# Altium footprint library smd-ipc.PCBLIB: 363 footprints (part 23 of 27)
Each footprint in its own frame and in the unit in brackets; x right, y up, seen from the top. Pads: shape width x height; smd on the part's side, far side on the other; paste and mask are expansions set on the pad; w line width, h text height; cw(c..) or ccw(c..) is an arc to the next point about the centre after c.
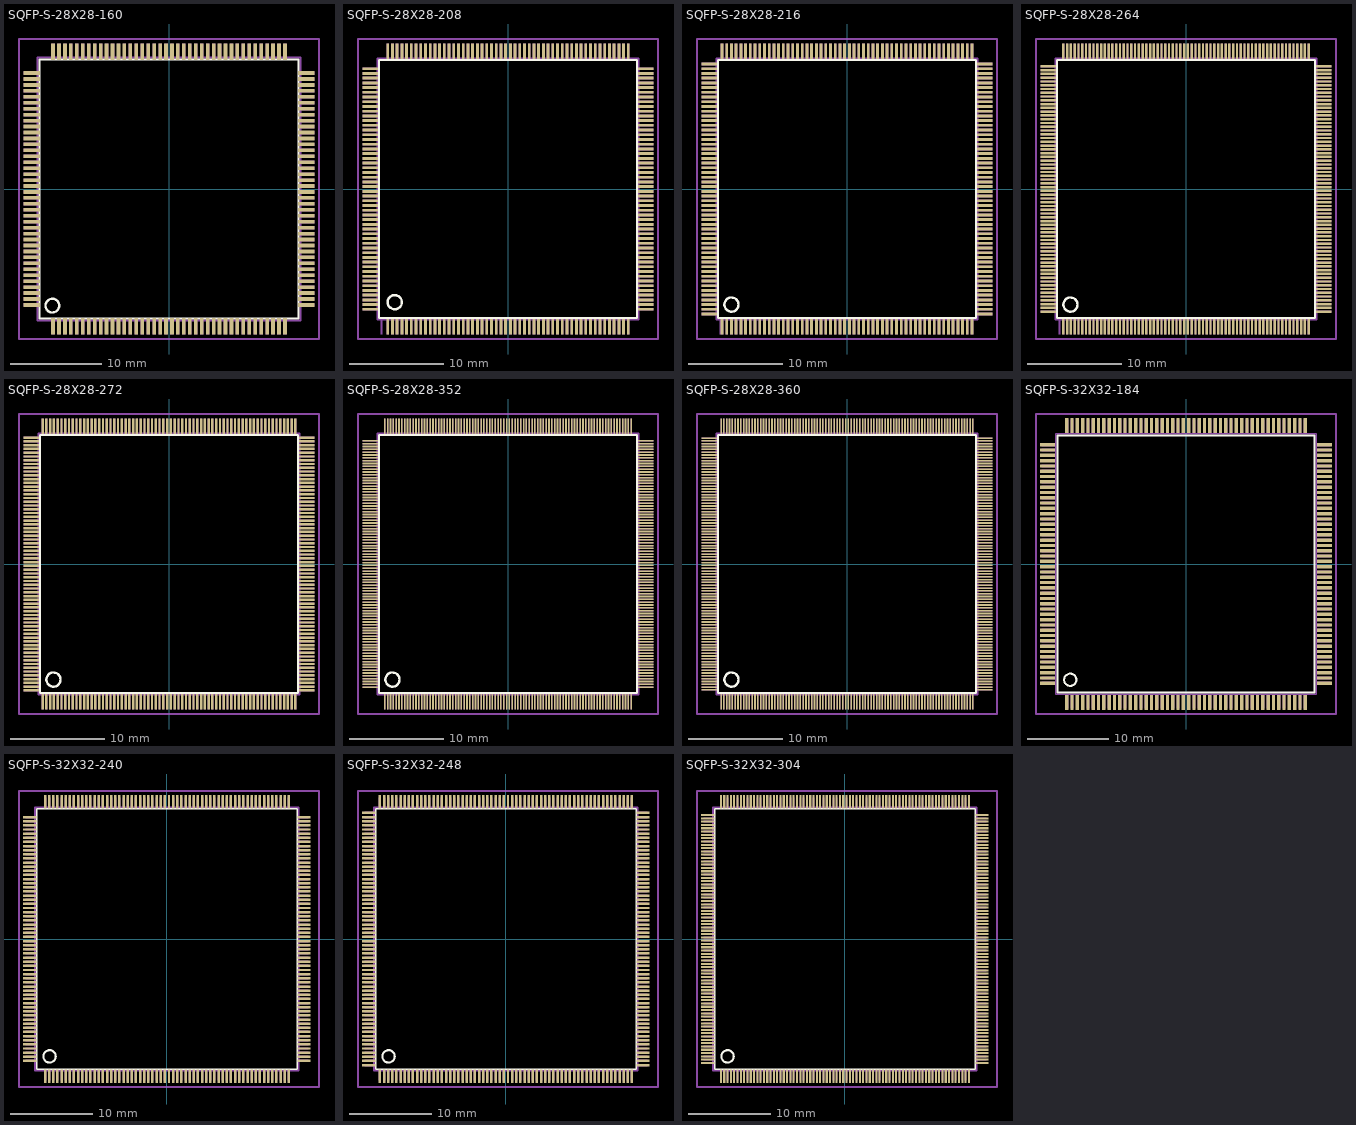
[diagram p22: the footprints below, top view; thin cyan lines are the x and y axes]

## SQFP-S-28X28-160 [mm]
pads (160):
  rect 0.4x1.8 smd: 1(-12.675,-15) 2(-12.025,-15) 3(-11.375,-15) 4(-10.725,-15) 5(-10.075,-15) 6(-9.425,-15) 7(-8.775,-15) 8(-8.125,-15) 9(-7.475,-15) 10(-6.825,-15) 11(-6.175,-15) 12(-5.525,-15) 13(-4.875,-15) 14(-4.225,-15) 15(-3.575,-15) 16(-2.925,-15) 17(-2.275,-15) 18(-1.625,-15) 19(-0.975,-15) 20(-0.325,-15) 21(0.325,-15) 22(0.975,-15) 23(1.625,-15) 24(2.275,-15) 25(2.925,-15) 26(3.575,-15) 27(4.225,-15) 28(4.875,-15) 29(5.525,-15) 30(6.175,-15) 31(6.825,-15) 32(7.475,-15) 33(8.125,-15) 34(8.775,-15) 35(9.425,-15) 36(10.075,-15) 37(10.725,-15) 38(11.375,-15) 39(12.025,-15) 40(12.675,-15) 81(12.675,15) 82(12.025,15) 83(11.375,15) 84(10.725,15) 85(10.075,15) 86(9.425,15) 87(8.775,15) 88(8.125,15) 89(7.475,15) 90(6.825,15) 91(6.175,15) 92(5.525,15) 93(4.875,15) 94(4.225,15) 95(3.575,15) 96(2.925,15) 97(2.275,15) 98(1.625,15) 99(0.975,15) 100(0.325,15) 101(-0.325,15) 102(-0.975,15) 103(-1.625,15) 104(-2.275,15) 105(-2.925,15) 106(-3.575,15) 107(-4.225,15) 108(-4.875,15) 109(-5.525,15) 110(-6.175,15) 111(-6.825,15) 112(-7.475,15) 113(-8.125,15) 114(-8.775,15) 115(-9.425,15) 116(-10.075,15) 117(-10.725,15) 118(-11.375,15) 119(-12.025,15) 120(-12.675,15)
  rect 1.8x0.4 smd: 41(15,-12.675) 42(15,-12.025) 43(15,-11.375) 44(15,-10.725) 45(15,-10.075) 46(15,-9.425) 47(15,-8.775) 48(15,-8.125) 49(15,-7.475) 50(15,-6.825) 51(15,-6.175) 52(15,-5.525) 53(15,-4.875) 54(15,-4.225) 55(15,-3.575) 56(15,-2.925) 57(15,-2.275) 58(15,-1.625) 59(15,-0.975) 60(15,-0.325) 61(15,0.325) 62(15,0.975) 63(15,1.625) 64(15,2.275) 65(15,2.925) 66(15,3.575) 67(15,4.225) 68(15,4.875) 69(15,5.525) 70(15,6.175) 71(15,6.825) 72(15,7.475) 73(15,8.125) 74(15,8.775) 75(15,9.425) 76(15,10.075) 77(15,10.725) 78(15,11.375) 79(15,12.025) 80(15,12.675) 121(-15,12.675) 122(-15,12.025) 123(-15,11.375) 124(-15,10.725) 125(-15,10.075) 126(-15,9.425) 127(-15,8.775) 128(-15,8.125) 129(-15,7.475) 130(-15,6.825) 131(-15,6.175) 132(-15,5.525) 133(-15,4.875) 134(-15,4.225) 135(-15,3.575) 136(-15,2.925) 137(-15,2.275) 138(-15,1.625) 139(-15,0.975) 140(-15,0.325) 141(-15,-0.325) 142(-15,-0.975) 143(-15,-1.625) 144(-15,-2.275) 145(-15,-2.925) 146(-15,-3.575) 147(-15,-4.225) 148(-15,-4.875) 149(-15,-5.525) 150(-15,-6.175) 151(-15,-6.825) 152(-15,-7.475) 153(-15,-8.125) 154(-15,-8.775) 155(-15,-9.425) 156(-15,-10.075) 157(-15,-10.725) 158(-15,-11.375) 159(-15,-12.025) 160(-15,-12.675)
Top Overlay:
  circle w0.254: c-12.75,-12.75 r0.75
  lines w0.203: -14.17,-14.16 14.16,-14.16 14.16,14.16 -14.17,14.16 -14.17,-14.16
Mechanical 16:
  drawing of 164 lines, arcs and shapes, not listed
Mechanical 27:
  lines w0.2: -16.4,-16.4 -16.4,16.4 16.4,16.4 16.4,-16.4 -16.4,-16.4

## SQFP-S-28X28-208 [mm]
pads (208):
  rect 0.3x1.6 smd: 1(-12.75,-14.6) 2(-12.25,-14.6) 3(-11.75,-14.6) 4(-11.25,-14.6) 5(-10.75,-14.6) 6(-10.25,-14.6) 7(-9.75,-14.6) 8(-9.25,-14.6) 9(-8.75,-14.6) 10(-8.25,-14.6) 11(-7.75,-14.6) 12(-7.25,-14.6) 13(-6.75,-14.6) 14(-6.25,-14.6) 15(-5.75,-14.6) 16(-5.25,-14.6) 17(-4.75,-14.6) 18(-4.25,-14.6) 19(-3.75,-14.6) 20(-3.25,-14.6) 21(-2.75,-14.6) 22(-2.25,-14.6) 23(-1.75,-14.6) 24(-1.25,-14.6) 25(-0.75,-14.6) 26(-0.25,-14.6) 27(0.25,-14.6) 28(0.75,-14.6) 29(1.25,-14.6) 30(1.75,-14.6) 31(2.25,-14.6) 32(2.75,-14.6) 33(3.25,-14.6) 34(3.75,-14.6) 35(4.25,-14.6) 36(4.75,-14.6) 37(5.25,-14.6) 38(5.75,-14.6) 39(6.25,-14.6) 40(6.75,-14.6) 41(7.25,-14.6) 42(7.75,-14.6) 43(8.25,-14.6) 44(8.75,-14.6) 45(9.25,-14.6) 46(9.75,-14.6) 47(10.25,-14.6) 48(10.75,-14.6) 49(11.25,-14.6) 50(11.75,-14.6) 51(12.25,-14.6) 52(12.75,-14.6) 105(12.75,14.6) 106(12.25,14.6) 107(11.75,14.6) 108(11.25,14.6) 109(10.75,14.6) 110(10.25,14.6) 111(9.75,14.6) 112(9.25,14.6) 113(8.75,14.6) 114(8.25,14.6) 115(7.75,14.6) 116(7.25,14.6) 117(6.75,14.6) 118(6.25,14.6) 119(5.75,14.6) 120(5.25,14.6) 121(4.75,14.6) 122(4.25,14.6) 123(3.75,14.6) 124(3.25,14.6) 125(2.75,14.6) 126(2.25,14.6) 127(1.75,14.6) 128(1.25,14.6) 129(0.75,14.6) 130(0.25,14.6) 131(-0.25,14.6) 132(-0.75,14.6) 133(-1.25,14.6) 134(-1.75,14.6) 135(-2.25,14.6) 136(-2.75,14.6) 137(-3.25,14.6) 138(-3.75,14.6) 139(-4.25,14.6) 140(-4.75,14.6) 141(-5.25,14.6) 142(-5.75,14.6) 143(-6.25,14.6) 144(-6.75,14.6) 145(-7.25,14.6) 146(-7.75,14.6) 147(-8.25,14.6) 148(-8.75,14.6) 149(-9.25,14.6) 150(-9.75,14.6) 151(-10.25,14.6) 152(-10.75,14.6) 153(-11.25,14.6) 154(-11.75,14.6) 155(-12.25,14.6) 156(-12.75,14.6)
  rect 1.6x0.3 smd: 53(14.6,-12.75) 54(14.6,-12.25) 55(14.6,-11.75) 56(14.6,-11.25) 57(14.6,-10.75) 58(14.6,-10.25) 59(14.6,-9.75) 60(14.6,-9.25) 61(14.6,-8.75) 62(14.6,-8.25) 63(14.6,-7.75) 64(14.6,-7.25) 65(14.6,-6.75) 66(14.6,-6.25) 67(14.6,-5.75) 68(14.6,-5.25) 69(14.6,-4.75) 70(14.6,-4.25) 71(14.6,-3.75) 72(14.6,-3.25) 73(14.6,-2.75) 74(14.6,-2.25) 75(14.6,-1.75) 76(14.6,-1.25) 77(14.6,-0.75) 78(14.6,-0.25) 79(14.6,0.25) 80(14.6,0.75) 81(14.6,1.25) 82(14.6,1.75) 83(14.6,2.25) 84(14.6,2.75) 85(14.6,3.25) 86(14.6,3.75) 87(14.6,4.25) 88(14.6,4.75) 89(14.6,5.25) 90(14.6,5.75) 91(14.6,6.25) 92(14.6,6.75) 93(14.6,7.25) 94(14.6,7.75) 95(14.6,8.25) 96(14.6,8.75) 97(14.6,9.25) 98(14.6,9.75) 99(14.6,10.25) 100(14.6,10.75) 101(14.6,11.25) 102(14.6,11.75) 103(14.6,12.25) 104(14.6,12.75) 157(-14.6,12.75) 158(-14.6,12.25) 159(-14.6,11.75) 160(-14.6,11.25) 161(-14.6,10.75) 162(-14.6,10.25) 163(-14.6,9.75) 164(-14.6,9.25) 165(-14.6,8.75) 166(-14.6,8.25) 167(-14.6,7.75) 168(-14.6,7.25) 169(-14.6,6.75) 170(-14.6,6.25) 171(-14.6,5.75) 172(-14.6,5.25) 173(-14.6,4.75) 174(-14.6,4.25) 175(-14.6,3.75) 176(-14.6,3.25) 177(-14.6,2.75) 178(-14.6,2.25) 179(-14.6,1.75) 180(-14.6,1.25) 181(-14.6,0.75) 182(-14.6,0.25) 183(-14.6,-0.25) 184(-14.6,-0.75) 185(-14.6,-1.25) 186(-14.6,-1.75) 187(-14.6,-2.25) 188(-14.6,-2.75) 189(-14.6,-3.25) 190(-14.6,-3.75) 191(-14.6,-4.25) 192(-14.6,-4.75) 193(-14.6,-5.25) 194(-14.6,-5.75) 195(-14.6,-6.25) 196(-14.6,-6.75) 197(-14.6,-7.25) 198(-14.6,-7.75) 199(-14.6,-8.25) 200(-14.6,-8.75) 201(-14.6,-9.25) 202(-14.6,-9.75) 203(-14.6,-10.25) 204(-14.6,-10.75) 205(-14.6,-11.25) 206(-14.6,-11.75) 207(-14.6,-12.25) 208(-14.6,-12.75)
Top Overlay:
  circle w0.254: c-12,-12 r0.75
  lines w0.203: -13.67,-13.66 13.66,-13.66 13.66,13.66 -13.67,13.66 -13.67,-13.66
Mechanical 16:
  drawing of 213 lines, arcs and shapes, not listed
Mechanical 27:
  lines w0.2: -15.9,-15.9 -15.9,15.9 15.9,15.9 15.9,-15.9 -15.9,-15.9

## SQFP-S-28X28-216 [mm]
pads (216):
  rect 0.3x1.6 smd: 1(-13.25,-14.6) 2(-12.75,-14.6) 3(-12.25,-14.6) 4(-11.75,-14.6) 5(-11.25,-14.6) 6(-10.75,-14.6) 7(-10.25,-14.6) 8(-9.75,-14.6) 9(-9.25,-14.6) 10(-8.75,-14.6) 11(-8.25,-14.6) 12(-7.75,-14.6) 13(-7.25,-14.6) 14(-6.75,-14.6) 15(-6.25,-14.6) 16(-5.75,-14.6) 17(-5.25,-14.6) 18(-4.75,-14.6) 19(-4.25,-14.6) 20(-3.75,-14.6) 21(-3.25,-14.6) 22(-2.75,-14.6) 23(-2.25,-14.6) 24(-1.75,-14.6) 25(-1.25,-14.6) 26(-0.75,-14.6) 27(-0.25,-14.6) 28(0.25,-14.6) 29(0.75,-14.6) 30(1.25,-14.6) 31(1.75,-14.6) 32(2.25,-14.6) 33(2.75,-14.6) 34(3.25,-14.6) 35(3.75,-14.6) 36(4.25,-14.6) 37(4.75,-14.6) 38(5.25,-14.6) 39(5.75,-14.6) 40(6.25,-14.6) 41(6.75,-14.6) 42(7.25,-14.6) 43(7.75,-14.6) 44(8.25,-14.6) 45(8.75,-14.6) 46(9.25,-14.6) 47(9.75,-14.6) 48(10.25,-14.6) 49(10.75,-14.6) 50(11.25,-14.6) 51(11.75,-14.6) 52(12.25,-14.6) 53(12.75,-14.6) 54(13.25,-14.6) 109(13.25,14.6) 110(12.75,14.6) 111(12.25,14.6) 112(11.75,14.6) 113(11.25,14.6) 114(10.75,14.6) 115(10.25,14.6) 116(9.75,14.6) 117(9.25,14.6) 118(8.75,14.6) 119(8.25,14.6) 120(7.75,14.6) 121(7.25,14.6) 122(6.75,14.6) 123(6.25,14.6) 124(5.75,14.6) 125(5.25,14.6) 126(4.75,14.6) 127(4.25,14.6) 128(3.75,14.6) 129(3.25,14.6) 130(2.75,14.6) 131(2.25,14.6) 132(1.75,14.6) 133(1.25,14.6) 134(0.75,14.6) 135(0.25,14.6) 136(-0.25,14.6) 137(-0.75,14.6) 138(-1.25,14.6) 139(-1.75,14.6) 140(-2.25,14.6) 141(-2.75,14.6) 142(-3.25,14.6) 143(-3.75,14.6) 144(-4.25,14.6) 145(-4.75,14.6) 146(-5.25,14.6) 147(-5.75,14.6) 148(-6.25,14.6) 149(-6.75,14.6) 150(-7.25,14.6) 151(-7.75,14.6) 152(-8.25,14.6) 153(-8.75,14.6) 154(-9.25,14.6) 155(-9.75,14.6) 156(-10.25,14.6) 157(-10.75,14.6) 158(-11.25,14.6) 159(-11.75,14.6) 160(-12.25,14.6) 161(-12.75,14.6) 162(-13.25,14.6)
  rect 1.6x0.3 smd: 55(14.6,-13.25) 56(14.6,-12.75) 57(14.6,-12.25) 58(14.6,-11.75) 59(14.6,-11.25) 60(14.6,-10.75) 61(14.6,-10.25) 62(14.6,-9.75) 63(14.6,-9.25) 64(14.6,-8.75) 65(14.6,-8.25) 66(14.6,-7.75) 67(14.6,-7.25) 68(14.6,-6.75) 69(14.6,-6.25) 70(14.6,-5.75) 71(14.6,-5.25) 72(14.6,-4.75) 73(14.6,-4.25) 74(14.6,-3.75) 75(14.6,-3.25) 76(14.6,-2.75) 77(14.6,-2.25) 78(14.6,-1.75) 79(14.6,-1.25) 80(14.6,-0.75) 81(14.6,-0.25) 82(14.6,0.25) 83(14.6,0.75) 84(14.6,1.25) 85(14.6,1.75) 86(14.6,2.25) 87(14.6,2.75) 88(14.6,3.25) 89(14.6,3.75) 90(14.6,4.25) 91(14.6,4.75) 92(14.6,5.25) 93(14.6,5.75) 94(14.6,6.25) 95(14.6,6.75) 96(14.6,7.25) 97(14.6,7.75) 98(14.6,8.25) 99(14.6,8.75) 100(14.6,9.25) 101(14.6,9.75) 102(14.6,10.25) 103(14.6,10.75) 104(14.6,11.25) 105(14.6,11.75) 106(14.6,12.25) 107(14.6,12.75) 108(14.6,13.25) 163(-14.6,13.25) 164(-14.6,12.75) 165(-14.6,12.25) 166(-14.6,11.75) 167(-14.6,11.25) 168(-14.6,10.75) 169(-14.6,10.25) 170(-14.6,9.75) 171(-14.6,9.25) 172(-14.6,8.75) 173(-14.6,8.25) 174(-14.6,7.75) 175(-14.6,7.25) 176(-14.6,6.75) 177(-14.6,6.25) 178(-14.6,5.75) 179(-14.6,5.25) 180(-14.6,4.75) 181(-14.6,4.25) 182(-14.6,3.75) 183(-14.6,3.25) 184(-14.6,2.75) 185(-14.6,2.25) 186(-14.6,1.75) 187(-14.6,1.25) 188(-14.6,0.75) 189(-14.6,0.25) 190(-14.6,-0.25) 191(-14.6,-0.75) 192(-14.6,-1.25) 193(-14.6,-1.75) 194(-14.6,-2.25) 195(-14.6,-2.75) 196(-14.6,-3.25) 197(-14.6,-3.75) 198(-14.6,-4.25) 199(-14.6,-4.75) 200(-14.6,-5.25) 201(-14.6,-5.75) 202(-14.6,-6.25) 203(-14.6,-6.75) 204(-14.6,-7.25) 205(-14.6,-7.75) 206(-14.6,-8.25) 207(-14.6,-8.75) 208(-14.6,-9.25) 209(-14.6,-9.75) 210(-14.6,-10.25) 211(-14.6,-10.75) 212(-14.6,-11.25) 213(-14.6,-11.75) 214(-14.6,-12.25) 215(-14.6,-12.75) 216(-14.6,-13.25)
Top Overlay:
  circle w0.254: c-12.25,-12.25 r0.75
  lines w0.203: -13.67,-13.66 13.66,-13.66 13.66,13.66 -13.67,13.66 -13.67,-13.66
Mechanical 16:
  drawing of 221 lines, arcs and shapes, not listed
Mechanical 27:
  lines w0.2: -15.9,-15.9 -15.9,15.9 15.9,15.9 15.9,-15.9 -15.9,-15.9

## SQFP-S-28X28-264 [mm]
pads (264):
  rect 0.25x1.6 smd: 1(-13,-14.6) 2(-12.6,-14.6) 3(-12.2,-14.6) 4(-11.8,-14.6) 5(-11.4,-14.6) 6(-11,-14.6) 7(-10.6,-14.6) 8(-10.2,-14.6) 9(-9.8,-14.6) 10(-9.4,-14.6) 11(-9,-14.6) 12(-8.6,-14.6) 13(-8.2,-14.6) 14(-7.8,-14.6) 15(-7.4,-14.6) 16(-7,-14.6) 17(-6.6,-14.6) 18(-6.2,-14.6) 19(-5.8,-14.6) 20(-5.4,-14.6) 21(-5,-14.6) 22(-4.6,-14.6) 23(-4.2,-14.6) 24(-3.8,-14.6) 25(-3.4,-14.6) 26(-3,-14.6) 27(-2.6,-14.6) 28(-2.2,-14.6) 29(-1.8,-14.6) 30(-1.4,-14.6) 31(-1,-14.6) 32(-0.6,-14.6) 33(-0.2,-14.6) 34(0.2,-14.6) 35(0.6,-14.6) 36(1,-14.6) 37(1.4,-14.6) 38(1.8,-14.6) 39(2.2,-14.6) 40(2.6,-14.6) 41(3,-14.6) 42(3.4,-14.6) 43(3.8,-14.6) 44(4.2,-14.6) 45(4.6,-14.6) 46(5,-14.6) 47(5.4,-14.6) 48(5.8,-14.6) 49(6.2,-14.6) 50(6.6,-14.6) 51(7,-14.6) 52(7.4,-14.6) 53(7.8,-14.6) 54(8.2,-14.6) 55(8.6,-14.6) 56(9,-14.6) 57(9.4,-14.6) 58(9.8,-14.6) 59(10.2,-14.6) 60(10.6,-14.6) 61(11,-14.6) 62(11.4,-14.6) 63(11.8,-14.6) 64(12.2,-14.6) 65(12.6,-14.6) 66(13,-14.6) 133(13,14.6) 134(12.6,14.6) 135(12.2,14.6) 136(11.8,14.6) 137(11.4,14.6) 138(11,14.6) 139(10.6,14.6) 140(10.2,14.6) 141(9.8,14.6) 142(9.4,14.6) 143(9,14.6) 144(8.6,14.6) 145(8.2,14.6) 146(7.8,14.6) 147(7.4,14.6) 148(7,14.6) 149(6.6,14.6) 150(6.2,14.6) 151(5.8,14.6) 152(5.4,14.6) 153(5,14.6) 154(4.6,14.6) 155(4.2,14.6) 156(3.8,14.6) 157(3.4,14.6) 158(3,14.6) 159(2.6,14.6) 160(2.2,14.6) 161(1.8,14.6) 162(1.4,14.6) 163(1,14.6) 164(0.6,14.6) 165(0.2,14.6) 166(-0.2,14.6) 167(-0.6,14.6) 168(-1,14.6) 169(-1.4,14.6) 170(-1.8,14.6) 171(-2.2,14.6) 172(-2.6,14.6) 173(-3,14.6) 174(-3.4,14.6) 175(-3.8,14.6) 176(-4.2,14.6) 177(-4.6,14.6) 178(-5,14.6) 179(-5.4,14.6) 180(-5.8,14.6) 181(-6.2,14.6) 182(-6.6,14.6) 183(-7,14.6) 184(-7.4,14.6) 185(-7.8,14.6) 186(-8.2,14.6) 187(-8.6,14.6) 188(-9,14.6) 189(-9.4,14.6) 190(-9.8,14.6) 191(-10.2,14.6) 192(-10.6,14.6) 193(-11,14.6) 194(-11.4,14.6) 195(-11.8,14.6) 196(-12.2,14.6) 197(-12.6,14.6) 198(-13,14.6)
  rect 1.6x0.25 smd: 67(14.6,-13) 68(14.6,-12.6) 69(14.6,-12.2) 70(14.6,-11.8) 71(14.6,-11.4) 72(14.6,-11) 73(14.6,-10.6) 74(14.6,-10.2) 75(14.6,-9.8) 76(14.6,-9.4) 77(14.6,-9) 78(14.6,-8.6) 79(14.6,-8.2) 80(14.6,-7.8) 81(14.6,-7.4) 82(14.6,-7) 83(14.6,-6.6) 84(14.6,-6.2) 85(14.6,-5.8) 86(14.6,-5.4) 87(14.6,-5) 88(14.6,-4.6) 89(14.6,-4.2) 90(14.6,-3.8) 91(14.6,-3.4) 92(14.6,-3) 93(14.6,-2.6) 94(14.6,-2.2) 95(14.6,-1.8) 96(14.6,-1.4) 97(14.6,-1) 98(14.6,-0.6) 99(14.6,-0.2) 100(14.6,0.2) 101(14.6,0.6) 102(14.6,1) 103(14.6,1.4) 104(14.6,1.8) 105(14.6,2.2) 106(14.6,2.6) 107(14.6,3) 108(14.6,3.4) 109(14.6,3.8) 110(14.6,4.2) 111(14.6,4.6) 112(14.6,5) 113(14.6,5.4) 114(14.6,5.8) 115(14.6,6.2) 116(14.6,6.6) 117(14.6,7) 118(14.6,7.4) 119(14.6,7.8) 120(14.6,8.2) 121(14.6,8.6) 122(14.6,9) 123(14.6,9.4) 124(14.6,9.8) 125(14.6,10.2) 126(14.6,10.6) 127(14.6,11) 128(14.6,11.4) 129(14.6,11.8) 130(14.6,12.2) 131(14.6,12.6) 132(14.6,13) 199(-14.6,13) 200(-14.6,12.6) 201(-14.6,12.2) 202(-14.6,11.8) 203(-14.6,11.4) 204(-14.6,11) 205(-14.6,10.6) 206(-14.6,10.2) 207(-14.6,9.8) 208(-14.6,9.4) 209(-14.6,9) 210(-14.6,8.6) 211(-14.6,8.2) 212(-14.6,7.8) 213(-14.6,7.4) 214(-14.6,7) 215(-14.6,6.6) 216(-14.6,6.2) 217(-14.6,5.8) 218(-14.6,5.4) 219(-14.6,5) 220(-14.6,4.6) 221(-14.6,4.2) 222(-14.6,3.8) 223(-14.6,3.4) 224(-14.6,3) 225(-14.6,2.6) 226(-14.6,2.2) 227(-14.6,1.8) 228(-14.6,1.4) 229(-14.6,1) 230(-14.6,0.6) 231(-14.6,0.2) 232(-14.6,-0.2) 233(-14.6,-0.6) 234(-14.6,-1) 235(-14.6,-1.4) 236(-14.6,-1.8) 237(-14.6,-2.2) 238(-14.6,-2.6) 239(-14.6,-3) 240(-14.6,-3.4) 241(-14.6,-3.8) 242(-14.6,-4.2) 243(-14.6,-4.6) 244(-14.6,-5) 245(-14.6,-5.4) 246(-14.6,-5.8) 247(-14.6,-6.2) 248(-14.6,-6.6) 249(-14.6,-7) 250(-14.6,-7.4) 251(-14.6,-7.8) 252(-14.6,-8.2) 253(-14.6,-8.6) 254(-14.6,-9) 255(-14.6,-9.4) 256(-14.6,-9.8) 257(-14.6,-10.2) 258(-14.6,-10.6) 259(-14.6,-11) 260(-14.6,-11.4) 261(-14.6,-11.8) 262(-14.6,-12.2) 263(-14.6,-12.6) 264(-14.6,-13)
Top Overlay:
  circle w0.254: c-12.25,-12.25 r0.75
  lines w0.203: -13.67,-13.66 13.66,-13.66 13.66,13.66 -13.67,13.66 -13.67,-13.66
Mechanical 16:
  drawing of 269 lines, arcs and shapes, not listed
Mechanical 27:
  lines w0.2: -15.9,-15.9 -15.9,15.9 15.9,15.9 15.9,-15.9 -15.9,-15.9

## SQFP-S-28X28-272 [mm]
pads (272):
  rect 0.25x1.6 smd: 1(-13.4,-14.6) 2(-13,-14.6) 3(-12.6,-14.6) 4(-12.2,-14.6) 5(-11.8,-14.6) 6(-11.4,-14.6) 7(-11,-14.6) 8(-10.6,-14.6) 9(-10.2,-14.6) 10(-9.8,-14.6) 11(-9.4,-14.6) 12(-9,-14.6) 13(-8.6,-14.6) 14(-8.2,-14.6) 15(-7.8,-14.6) 16(-7.4,-14.6) 17(-7,-14.6) 18(-6.6,-14.6) 19(-6.2,-14.6) 20(-5.8,-14.6) 21(-5.4,-14.6) 22(-5,-14.6) 23(-4.6,-14.6) 24(-4.2,-14.6) 25(-3.8,-14.6) 26(-3.4,-14.6) 27(-3,-14.6) 28(-2.6,-14.6) 29(-2.2,-14.6) 30(-1.8,-14.6) 31(-1.4,-14.6) 32(-1,-14.6) 33(-0.6,-14.6) 34(-0.2,-14.6) 35(0.2,-14.6) 36(0.6,-14.6) 37(1,-14.6) 38(1.4,-14.6) 39(1.8,-14.6) 40(2.2,-14.6) 41(2.6,-14.6) 42(3,-14.6) 43(3.4,-14.6) 44(3.8,-14.6) 45(4.2,-14.6) 46(4.6,-14.6) 47(5,-14.6) 48(5.4,-14.6) 49(5.8,-14.6) 50(6.2,-14.6) 51(6.6,-14.6) 52(7,-14.6) 53(7.4,-14.6) 54(7.8,-14.6) 55(8.2,-14.6) 56(8.6,-14.6) 57(9,-14.6) 58(9.4,-14.6) 59(9.8,-14.6) 60(10.2,-14.6) 61(10.6,-14.6) 62(11,-14.6) 63(11.4,-14.6) 64(11.8,-14.6) 65(12.2,-14.6) 66(12.6,-14.6) 67(13,-14.6) 68(13.4,-14.6) 137(13.4,14.6) 138(13,14.6) 139(12.6,14.6) 140(12.2,14.6) 141(11.8,14.6) 142(11.4,14.6) 143(11,14.6) 144(10.6,14.6) 145(10.2,14.6) 146(9.8,14.6) 147(9.4,14.6) 148(9,14.6) 149(8.6,14.6) 150(8.2,14.6) 151(7.8,14.6) 152(7.4,14.6) 153(7,14.6) 154(6.6,14.6) 155(6.2,14.6) 156(5.8,14.6) 157(5.4,14.6) 158(5,14.6) 159(4.6,14.6) 160(4.2,14.6) 161(3.8,14.6) 162(3.4,14.6) 163(3,14.6) 164(2.6,14.6) 165(2.2,14.6) 166(1.8,14.6) 167(1.4,14.6) 168(1,14.6) 169(0.6,14.6) 170(0.2,14.6) 171(-0.2,14.6) 172(-0.6,14.6) 173(-1,14.6) 174(-1.4,14.6) 175(-1.8,14.6) 176(-2.2,14.6) 177(-2.6,14.6) 178(-3,14.6) 179(-3.4,14.6) 180(-3.8,14.6) 181(-4.2,14.6) 182(-4.6,14.6) 183(-5,14.6) 184(-5.4,14.6) 185(-5.8,14.6) 186(-6.2,14.6) 187(-6.6,14.6) 188(-7,14.6) 189(-7.4,14.6) 190(-7.8,14.6) 191(-8.2,14.6) 192(-8.6,14.6) 193(-9,14.6) 194(-9.4,14.6) 195(-9.8,14.6) 196(-10.2,14.6) 197(-10.6,14.6) 198(-11,14.6) 199(-11.4,14.6) 200(-11.8,14.6) 201(-12.2,14.6) 202(-12.6,14.6) 203(-13,14.6) 204(-13.4,14.6)
  rect 1.6x0.25 smd: 69(14.6,-13.4) 70(14.6,-13) 71(14.6,-12.6) 72(14.6,-12.2) 73(14.6,-11.8) 74(14.6,-11.4) 75(14.6,-11) 76(14.6,-10.6) 77(14.6,-10.2) 78(14.6,-9.8) 79(14.6,-9.4) 80(14.6,-9) 81(14.6,-8.6) 82(14.6,-8.2) 83(14.6,-7.8) 84(14.6,-7.4) 85(14.6,-7) 86(14.6,-6.6) 87(14.6,-6.2) 88(14.6,-5.8) 89(14.6,-5.4) 90(14.6,-5) 91(14.6,-4.6) 92(14.6,-4.2) 93(14.6,-3.8) 94(14.6,-3.4) 95(14.6,-3) 96(14.6,-2.6) 97(14.6,-2.2) 98(14.6,-1.8) 99(14.6,-1.4) 100(14.6,-1) 101(14.6,-0.6) 102(14.6,-0.2) 103(14.6,0.2) 104(14.6,0.6) 105(14.6,1) 106(14.6,1.4) 107(14.6,1.8) 108(14.6,2.2) 109(14.6,2.6) 110(14.6,3) 111(14.6,3.4) 112(14.6,3.8) 113(14.6,4.2) 114(14.6,4.6) 115(14.6,5) 116(14.6,5.4) 117(14.6,5.8) 118(14.6,6.2) 119(14.6,6.6) 120(14.6,7) 121(14.6,7.4) 122(14.6,7.8) 123(14.6,8.2) 124(14.6,8.6) 125(14.6,9) 126(14.6,9.4) 127(14.6,9.8) 128(14.6,10.2) 129(14.6,10.6) 130(14.6,11) 131(14.6,11.4) 132(14.6,11.8) 133(14.6,12.2) 134(14.6,12.6) 135(14.6,13) 136(14.6,13.4) 205(-14.6,13.4) 206(-14.6,13) 207(-14.6,12.6) 208(-14.6,12.2) 209(-14.6,11.8) 210(-14.6,11.4) 211(-14.6,11) 212(-14.6,10.6) 213(-14.6,10.2) 214(-14.6,9.8) 215(-14.6,9.4) 216(-14.6,9) 217(-14.6,8.6) 218(-14.6,8.2) 219(-14.6,7.8) 220(-14.6,7.4) 221(-14.6,7) 222(-14.6,6.6) 223(-14.6,6.2) 224(-14.6,5.8) 225(-14.6,5.4) 226(-14.6,5) 227(-14.6,4.6) 228(-14.6,4.2) 229(-14.6,3.8) 230(-14.6,3.4) 231(-14.6,3) 232(-14.6,2.6) 233(-14.6,2.2) 234(-14.6,1.8) 235(-14.6,1.4) 236(-14.6,1) 237(-14.6,0.6) 238(-14.6,0.2) 239(-14.6,-0.2) 240(-14.6,-0.6) 241(-14.6,-1) 242(-14.6,-1.4) 243(-14.6,-1.8) 244(-14.6,-2.2) 245(-14.6,-2.6) 246(-14.6,-3) 247(-14.6,-3.4) 248(-14.6,-3.8) 249(-14.6,-4.2) 250(-14.6,-4.6) 251(-14.6,-5) 252(-14.6,-5.4) 253(-14.6,-5.8) 254(-14.6,-6.2) 255(-14.6,-6.6) 256(-14.6,-7) 257(-14.6,-7.4) 258(-14.6,-7.8) 259(-14.6,-8.2) 260(-14.6,-8.6) 261(-14.6,-9) 262(-14.6,-9.4) 263(-14.6,-9.8) 264(-14.6,-10.2) 265(-14.6,-10.6) 266(-14.6,-11) 267(-14.6,-11.4) 268(-14.6,-11.8) 269(-14.6,-12.2) 270(-14.6,-12.6) 271(-14.6,-13) 272(-14.6,-13.4)
Top Overlay:
  circle w0.254: c-12.25,-12.25 r0.75
  lines w0.203: -13.67,-13.66 13.66,-13.66 13.66,13.66 -13.67,13.66 -13.67,-13.66
Mechanical 16:
  drawing of 276 lines, arcs and shapes, not listed
Mechanical 27:
  lines w0.2: -15.9,-15.9 -15.9,15.9 15.9,15.9 15.9,-15.9 -15.9,-15.9

## SQFP-S-28X28-352 [mm]
pads (352):
  rect 0.17x1.6 smd: 1(-13.05,-14.6) 2(-12.75,-14.6) 3(-12.45,-14.6) 4(-12.15,-14.6) 5(-11.85,-14.6) 6(-11.55,-14.6) 7(-11.25,-14.6) 8(-10.95,-14.6) 9(-10.65,-14.6) 10(-10.35,-14.6) 11(-10.05,-14.6) 12(-9.75,-14.6) 13(-9.45,-14.6) 14(-9.15,-14.6) 15(-8.85,-14.6) 16(-8.55,-14.6) 17(-8.25,-14.6) 18(-7.95,-14.6) 19(-7.65,-14.6) 20(-7.35,-14.6) 21(-7.05,-14.6) 22(-6.75,-14.6) 23(-6.45,-14.6) 24(-6.15,-14.6) 25(-5.85,-14.6) 26(-5.55,-14.6) 27(-5.25,-14.6) 28(-4.95,-14.6) 29(-4.65,-14.6) 30(-4.35,-14.6) 31(-4.05,-14.6) 32(-3.75,-14.6) 33(-3.45,-14.6) 34(-3.15,-14.6) 35(-2.85,-14.6) 36(-2.55,-14.6) 37(-2.25,-14.6) 38(-1.95,-14.6) 39(-1.65,-14.6) 40(-1.35,-14.6) 41(-1.05,-14.6) 42(-0.75,-14.6) 43(-0.45,-14.6) 44(-0.15,-14.6) 45(0.15,-14.6) 46(0.45,-14.6) 47(0.75,-14.6) 48(1.05,-14.6) 49(1.35,-14.6) 50(1.65,-14.6) 51(1.95,-14.6) 52(2.25,-14.6) 53(2.55,-14.6) 54(2.85,-14.6) 55(3.15,-14.6) 56(3.45,-14.6) 57(3.75,-14.6) 58(4.05,-14.6) 59(4.35,-14.6) 60(4.65,-14.6) 61(4.95,-14.6) 62(5.25,-14.6) 63(5.55,-14.6) 64(5.85,-14.6) 65(6.15,-14.6) 66(6.45,-14.6) 67(6.75,-14.6) 68(7.05,-14.6) 69(7.35,-14.6) 70(7.65,-14.6) 71(7.95,-14.6) 72(8.25,-14.6) 73(8.55,-14.6) 74(8.85,-14.6) 75(9.15,-14.6) 76(9.45,-14.6) 77(9.75,-14.6) 78(10.05,-14.6) 79(10.35,-14.6) 80(10.65,-14.6) 81(10.95,-14.6) 82(11.25,-14.6) 83(11.55,-14.6) 84(11.85,-14.6) 85(12.15,-14.6) 86(12.45,-14.6) 87(12.75,-14.6) 88(13.05,-14.6) 177(13.05,14.6) 178(12.75,14.6) 179(12.45,14.6) 180(12.15,14.6) 181(11.85,14.6) 182(11.55,14.6) 183(11.25,14.6) 184(10.95,14.6) 185(10.65,14.6) 186(10.35,14.6) 187(10.05,14.6) 188(9.75,14.6) 189(9.45,14.6) 190(9.15,14.6) 191(8.85,14.6) 192(8.55,14.6) 193(8.25,14.6) 194(7.95,14.6) 195(7.65,14.6) 196(7.35,14.6) 197(7.05,14.6) 198(6.75,14.6) 199(6.45,14.6) 200(6.15,14.6) 201(5.85,14.6) 202(5.55,14.6) 203(5.25,14.6) 204(4.95,14.6) 205(4.65,14.6) 206(4.35,14.6) 207(4.05,14.6) 208(3.75,14.6) 209(3.45,14.6) 210(3.15,14.6) 211(2.85,14.6) 212(2.55,14.6) 213(2.25,14.6) 214(1.95,14.6) 215(1.65,14.6) 216(1.35,14.6) 217(1.05,14.6) 218(0.75,14.6) 219(0.45,14.6) 220(0.15,14.6) 221(-0.15,14.6) 222(-0.45,14.6) 223(-0.75,14.6) 224(-1.05,14.6) 225(-1.35,14.6) 226(-1.65,14.6) 227(-1.95,14.6) 228(-2.25,14.6) 229(-2.55,14.6) 230(-2.85,14.6) 231(-3.15,14.6) 232(-3.45,14.6) 233(-3.75,14.6) 234(-4.05,14.6) 235(-4.35,14.6) 236(-4.65,14.6) 237(-4.95,14.6) 238(-5.25,14.6) 239(-5.55,14.6) 240(-5.85,14.6) 241(-6.15,14.6) 242(-6.45,14.6) 243(-6.75,14.6) 244(-7.05,14.6) 245(-7.35,14.6) 246(-7.65,14.6) 247(-7.95,14.6) 248(-8.25,14.6) 249(-8.55,14.6) 250(-8.85,14.6) 251(-9.15,14.6) 252(-9.45,14.6) 253(-9.75,14.6) 254(-10.05,14.6) 255(-10.35,14.6) 256(-10.65,14.6) 257(-10.95,14.6) 258(-11.25,14.6) 259(-11.55,14.6) 260(-11.85,14.6) 261(-12.15,14.6) 262(-12.45,14.6) 263(-12.75,14.6) 264(-13.05,14.6)
  rect 1.6x0.17 smd: 89(14.6,-13.05) 90(14.6,-12.75) 91(14.6,-12.45) 92(14.6,-12.15) 93(14.6,-11.85) 94(14.6,-11.55) 95(14.6,-11.25) 96(14.6,-10.95) 97(14.6,-10.65) 98(14.6,-10.35) 99(14.6,-10.05) 100(14.6,-9.75) 101(14.6,-9.45) 102(14.6,-9.15) 103(14.6,-8.85) 104(14.6,-8.55) 105(14.6,-8.25) 106(14.6,-7.95) 107(14.6,-7.65) 108(14.6,-7.35) 109(14.6,-7.05) 110(14.6,-6.75) 111(14.6,-6.45) 112(14.6,-6.15) 113(14.6,-5.85) 114(14.6,-5.55) 115(14.6,-5.25) 116(14.6,-4.95) 117(14.6,-4.65) 118(14.6,-4.35) 119(14.6,-4.05) 120(14.6,-3.75) 121(14.6,-3.45) 122(14.6,-3.15) 123(14.6,-2.85) 124(14.6,-2.55) 125(14.6,-2.25) 126(14.6,-1.95) 127(14.6,-1.65) 128(14.6,-1.35) 129(14.6,-1.05) 130(14.6,-0.75) 131(14.6,-0.45) 132(14.6,-0.15) 133(14.6,0.15) 134(14.6,0.45) 135(14.6,0.75) 136(14.6,1.05) 137(14.6,1.35) 138(14.6,1.65) 139(14.6,1.95) 140(14.6,2.25) 141(14.6,2.55) 142(14.6,2.85) 143(14.6,3.15) 144(14.6,3.45) 145(14.6,3.75) 146(14.6,4.05) 147(14.6,4.35) 148(14.6,4.65) 149(14.6,4.95) 150(14.6,5.25) 151(14.6,5.55) 152(14.6,5.85) 153(14.6,6.15) 154(14.6,6.45) 155(14.6,6.75) 156(14.6,7.05) 157(14.6,7.35) 158(14.6,7.65) 159(14.6,7.95) 160(14.6,8.25) 161(14.6,8.55) 162(14.6,8.85) 163(14.6,9.15) 164(14.6,9.45) 165(14.6,9.75) 166(14.6,10.05) 167(14.6,10.35) 168(14.6,10.65) 169(14.6,10.95) 170(14.6,11.25) 171(14.6,11.55) 172(14.6,11.85) 173(14.6,12.15) 174(14.6,12.45) 175(14.6,12.75) 176(14.6,13.05) 265(-14.6,13.05) 266(-14.6,12.75) 267(-14.6,12.45) 268(-14.6,12.15) 269(-14.6,11.85) 270(-14.6,11.55) 271(-14.6,11.25) 272(-14.6,10.95) 273(-14.6,10.65) 274(-14.6,10.35) 275(-14.6,10.05) 276(-14.6,9.75) 277(-14.6,9.45) 278(-14.6,9.15) 279(-14.6,8.85) 280(-14.6,8.55) 281(-14.6,8.25) 282(-14.6,7.95) 283(-14.6,7.65) 284(-14.6,7.35) 285(-14.6,7.05) 286(-14.6,6.75) 287(-14.6,6.45) 288(-14.6,6.15) 289(-14.6,5.85) 290(-14.6,5.55) 291(-14.6,5.25) 292(-14.6,4.95) 293(-14.6,4.65) 294(-14.6,4.35) 295(-14.6,4.05) 296(-14.6,3.75) 297(-14.6,3.45) 298(-14.6,3.15) 299(-14.6,2.85) 300(-14.6,2.55) 301(-14.6,2.25) 302(-14.6,1.95) 303(-14.6,1.65) 304(-14.6,1.35) 305(-14.6,1.05) 306(-14.6,0.75) 307(-14.6,0.45) 308(-14.6,0.15) 309(-14.6,-0.15) 310(-14.6,-0.45) 311(-14.6,-0.75) 312(-14.6,-1.05) 313(-14.6,-1.35) 314(-14.6,-1.65) 315(-14.6,-1.95) 316(-14.6,-2.25) 317(-14.6,-2.55) 318(-14.6,-2.85) 319(-14.6,-3.15) 320(-14.6,-3.45) 321(-14.6,-3.75) 322(-14.6,-4.05) 323(-14.6,-4.35) 324(-14.6,-4.65) 325(-14.6,-4.95) 326(-14.6,-5.25) 327(-14.6,-5.55) 328(-14.6,-5.85) 329(-14.6,-6.15) 330(-14.6,-6.45) 331(-14.6,-6.75) 332(-14.6,-7.05) 333(-14.6,-7.35) 334(-14.6,-7.65) 335(-14.6,-7.95) 336(-14.6,-8.25) 337(-14.6,-8.55) 338(-14.6,-8.85) 339(-14.6,-9.15) 340(-14.6,-9.45) 341(-14.6,-9.75) 342(-14.6,-10.05) 343(-14.6,-10.35) 344(-14.6,-10.65) 345(-14.6,-10.95) 346(-14.6,-11.25) 347(-14.6,-11.55) 348(-14.6,-11.85) 349(-14.6,-12.15) 350(-14.6,-12.45) 351(-14.6,-12.75) 352(-14.6,-13.05)